# Altium footprint library SAMTEC SMD.PcbLib: 165 footprints (part 8 of 17)
Each footprint in its own frame and in the unit in brackets; x right, y up, seen from the top. Pads: shape width x height; smd on the part's side, far side on the other; paste and mask are expansions set on the pad; w line width, h text height; cw(c..) or ccw(c..) is an arc to the next point about the centre after c.
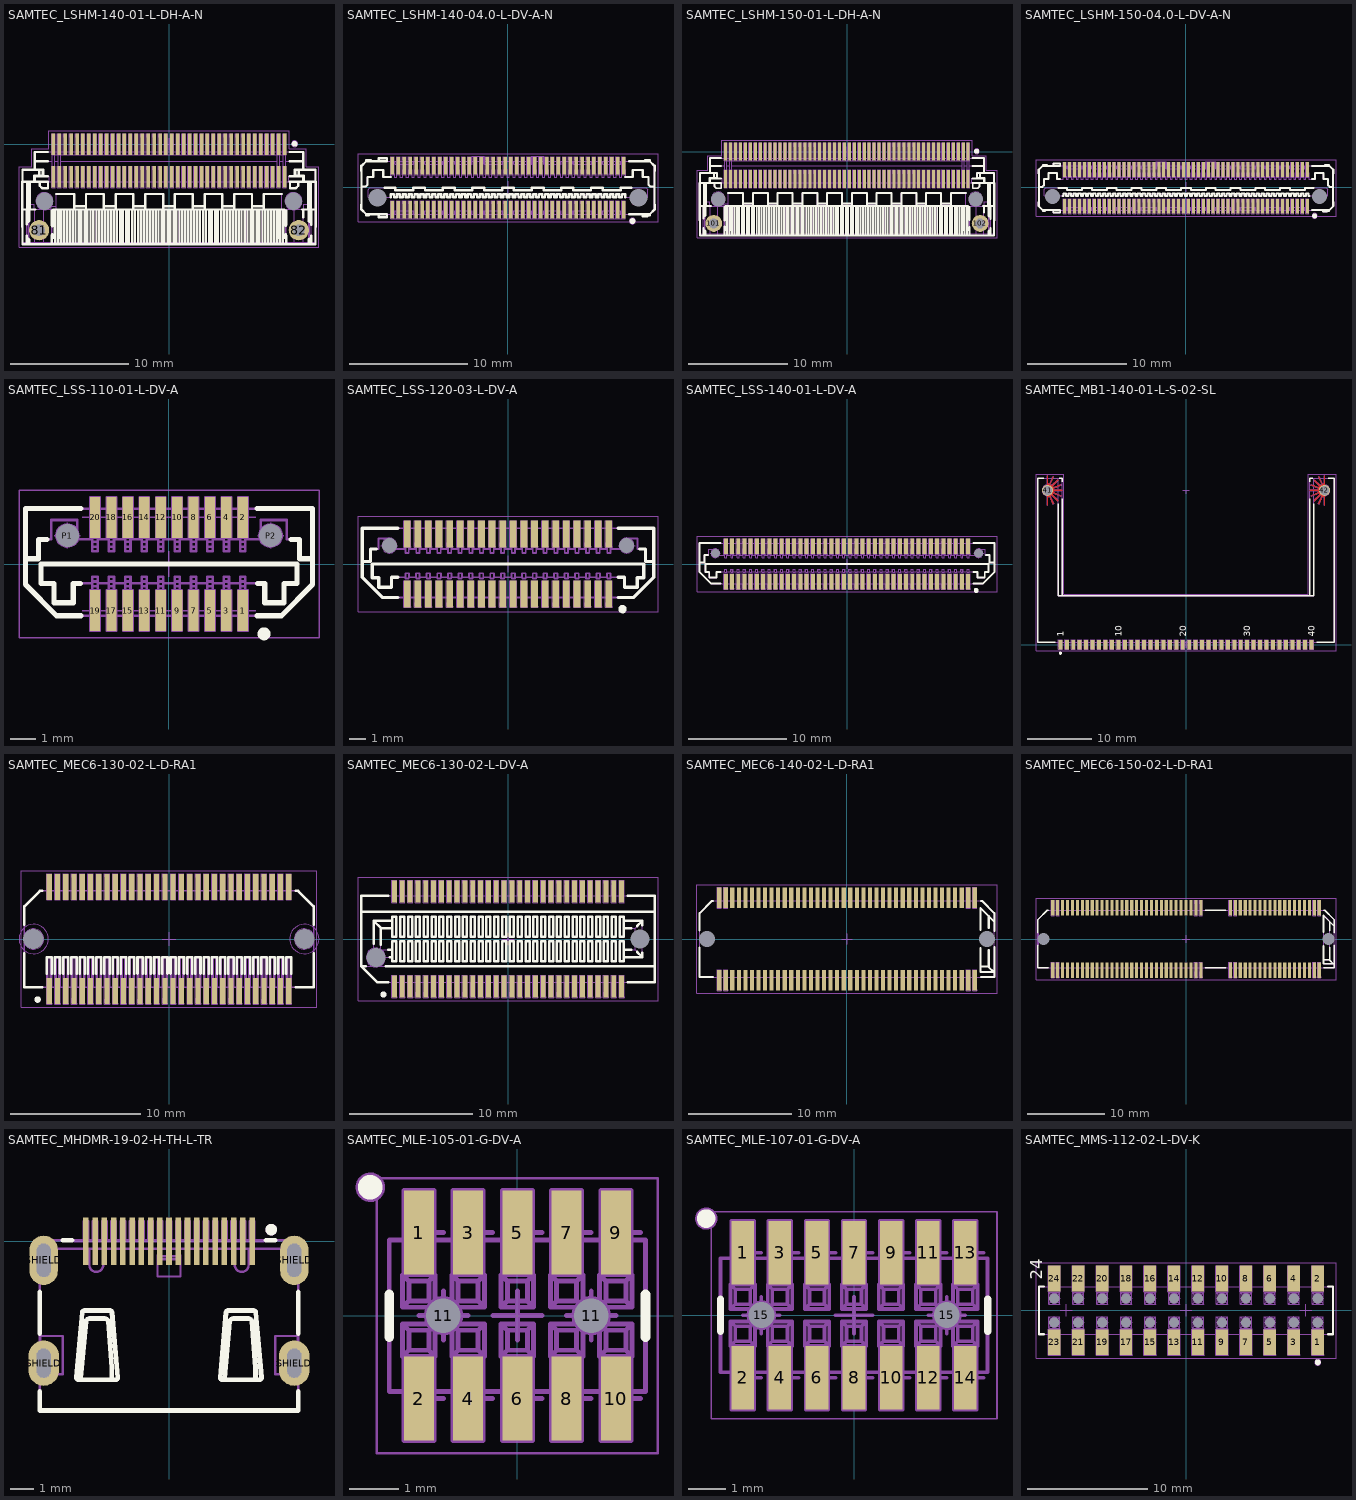
[diagram p7: the footprints below, top view; thin cyan lines are the x and y axes]

## SAMTEC_LSHM-140-01-L-DH-A-N [mm] "80 Contacts, Pitch 0.5mm, Razor Beam™ Right Angled High Speed Hermaphroditic Strip (Witout Shield)"
height 5.13
pads (84):
  rect 0.3x1.8 smd: 1(9.744,-0.003) 2(9.744,-2.753) 3(9.244,-0.003) 4(9.244,-2.753) 5(8.744,-0.003) 6(8.744,-2.753) 7(8.244,-0.003) 8(8.244,-2.753) 9(7.744,-0.003) 10(7.744,-2.753) 11(7.244,-0.003) 12(7.244,-2.753) 13(6.744,-0.003) 14(6.744,-2.753) 15(6.244,-0.003) 16(6.244,-2.753) 17(5.744,-0.003) 18(5.744,-2.753) 19(5.244,-0.003) 20(5.244,-2.753) 21(4.744,-0.003) 22(4.744,-2.753) 23(4.244,-0.003) 24(4.244,-2.753) 25(3.744,-0.003) 26(3.744,-2.753) 27(3.244,-0.003) 28(3.244,-2.753) 29(2.744,-0.003) 30(2.744,-2.753) 31(2.244,-0.003) 32(2.244,-2.753) 33(1.744,-0.003) 34(1.744,-2.753) 35(1.244,-0.003) 36(1.244,-2.753) 37(0.744,-0.003) 38(0.744,-2.753) 39(0.244,-0.003) 40(0.244,-2.753) 41(-0.256,-0.003) 42(-0.256,-2.753) 43(-0.756,-0.003) 44(-0.756,-2.753) 45(-1.256,-0.003) 46(-1.256,-2.753) 47(-1.756,-0.003) 48(-1.756,-2.753) 49(-2.256,-0.003) 50(-2.256,-2.753) 51(-2.756,-0.003) 52(-2.756,-2.753) 53(-3.256,-0.003) 54(-3.256,-2.753) 55(-3.756,-0.003) 56(-3.756,-2.753) 57(-4.256,-0.003) 58(-4.256,-2.753) 59(-4.756,-0.003) 60(-4.756,-2.753) 61(-5.256,-0.003) 62(-5.256,-2.753) 63(-5.756,-0.003) 64(-5.756,-2.753) 65(-6.256,-0.003) 66(-6.256,-2.753) 67(-6.756,-0.003) 68(-6.756,-2.753) 69(-7.256,-0.003) 70(-7.256,-2.753) 71(-7.756,-0.003) 72(-7.756,-2.753) 73(-8.256,-0.003) 74(-8.256,-2.753) 75(-8.756,-0.003) 76(-8.756,-2.753) 77(-9.256,-0.003) 78(-9.256,-2.753) 79(-9.756,-0.003) 80(-9.756,-2.753)
  round 1.7 hole 1: 81(-10.956,-7.253) 82(10.944,-7.253)
  round 0.5 hole 1.45 unplated mask+0.475: 83(-10.506,-4.803) 84(10.494,-4.803)
Top Overlay:
  drawing of 185 lines, arcs and shapes, not listed
Mechanical 8:
  drawing of 507 lines, arcs and shapes, not listed
Mechanical 14:
  drawing of 203 lines, arcs and shapes, not listed
Mechanical 15:
  lines w0.05: -12.65,-8.703 12.65,-8.703 12.65,-1.903 11.565,-1.903 11.565,-0.403 10.144,-0.403 10.144,1.147 -10.156,1.147 -10.156,-0.403 -11.565,-0.403 -11.565,-1.903 -12.65,-1.903 -12.65,-8.703
3D body "SAMTEC_LSHM-140-01-L-DH-A-N.stp": height 5.13, standoff -1.4, extent -12.4,-8.452 12.4,0.55

## SAMTEC_LSHM-140-04.0-L-DV-A-N [mm] "80 Contacts, Pitch 0.5mm, Razor Beam Vertical High Speed Hermaphroditic Strip (Witout Shield)"
height 5.45
pads (82):
  rect 0.3x1.5 smd: 1(9.75,-1.9) 2(9.75,1.8) 3(9.25,-1.9) 4(9.25,1.8) 5(8.75,-1.9) 6(8.75,1.8) 7(8.25,-1.9) 8(8.25,1.8) 9(7.75,-1.9) 10(7.75,1.8) 11(7.25,-1.9) 12(7.25,1.8) 13(6.75,-1.9) 14(6.75,1.8) 15(6.25,-1.9) 16(6.25,1.8) 17(5.75,-1.9) 18(5.75,1.8) 19(5.25,-1.9) 20(5.25,1.8) 21(4.75,-1.9) 22(4.75,1.8) 23(4.25,-1.9) 24(4.25,1.8) 25(3.75,-1.9) 26(3.75,1.8) 27(3.25,-1.9) 28(3.25,1.8) 29(2.75,-1.9) 30(2.75,1.8) 31(2.25,-1.9) 32(2.25,1.8) 33(1.75,-1.9) 34(1.75,1.8) 35(1.25,-1.9) 36(1.25,1.8) 37(0.75,-1.9) 38(0.75,1.8) 39(0.25,-1.9) 40(0.25,1.8) 41(-0.25,-1.9) 42(-0.25,1.8) 43(-0.75,-1.9) 44(-0.75,1.8) 45(-1.25,-1.9) 46(-1.25,1.8) 47(-1.75,-1.9) 48(-1.75,1.8) 49(-2.25,-1.9) 50(-2.25,1.8) 51(-2.75,-1.9) 52(-2.75,1.8) 53(-3.25,-1.9) 54(-3.25,1.8) 55(-3.75,-1.9) 56(-3.75,1.8) 57(-4.25,-1.9) 58(-4.25,1.8) 59(-4.75,-1.9) 60(-4.75,1.8) 61(-5.25,-1.9) 62(-5.25,1.8) 63(-5.75,-1.9) 64(-5.75,1.8) 65(-6.25,-1.9) 66(-6.25,1.8) 67(-6.75,-1.9) 68(-6.75,1.8) 69(-7.25,-1.9) 70(-7.25,1.8) 71(-7.75,-1.9) 72(-7.75,1.8) 73(-8.25,-1.9) 74(-8.25,1.8) 75(-8.75,-1.9) 76(-8.75,1.8) 77(-9.25,-1.9) 78(-9.25,1.8) 79(-9.75,-1.9) 80(-9.75,1.8)
  round 0.5 hole 1.5 unplated mask+0.5: 81(-11,-0.9) 82(11,-0.9)
Top Overlay:
  drawing of 251 lines, arcs and shapes, not listed
Mechanical 8:
  drawing of 493 lines, arcs and shapes, not listed
Mechanical 14:
  drawing of 472 lines, arcs and shapes, not listed
Mechanical 15:
  lines w0.05: -12.65,-2.9 -12.65,2.8 12.65,2.8 12.65,-2.9 -12.65,-2.9
3D body "SAMTEC_LSHM-140-04.0-L-DV-A-N.stp": height 5.45, standoff -0.85, extent -12.4,-2.54 12.4,2.59

## SAMTEC_LSHM-150-01-L-DH-A-N [mm] "100 Contacts, Pitch 0.5mm, Razor Beam™ Right Angled High Speed Hermaphroditic Strip (Witout Shield)"
height 5.13
pads (104):
  rect 0.3x1.8 smd: 1(12.244,-0.003) 2(12.244,-2.753) 3(11.744,-0.003) 4(11.744,-2.753) 5(11.244,-0.003) 6(11.244,-2.753) 7(10.744,-0.003) 8(10.744,-2.753) 9(10.244,-0.003) 10(10.244,-2.753) 11(9.744,-0.003) 12(9.744,-2.753) 13(9.244,-0.003) 14(9.244,-2.753) 15(8.744,-0.003) 16(8.744,-2.753) 17(8.244,-0.003) 18(8.244,-2.753) 19(7.744,-0.003) 20(7.744,-2.753) 21(7.244,-0.003) 22(7.244,-2.753) 23(6.744,-0.003) 24(6.744,-2.753) 25(6.244,-0.003) 26(6.244,-2.753) 27(5.744,-0.003) 28(5.744,-2.753) 29(5.244,-0.003) 30(5.244,-2.753) 31(4.744,-0.003) 32(4.744,-2.753) 33(4.244,-0.003) 34(4.244,-2.753) 35(3.744,-0.003) 36(3.744,-2.753) 37(3.244,-0.003) 38(3.244,-2.753) 39(2.744,-0.003) 40(2.744,-2.753) 41(2.244,-0.003) 42(2.244,-2.753) 43(1.744,-0.003) 44(1.744,-2.753) 45(1.244,-0.003) 46(1.244,-2.753) 47(0.744,-0.003) 48(0.744,-2.753) 49(0.244,-0.003) 50(0.244,-2.753) 51(-0.256,-0.003) 52(-0.256,-2.753) 53(-0.756,-0.003) 54(-0.756,-2.753) 55(-1.256,-0.003) 56(-1.256,-2.753) 57(-1.756,-0.003) 58(-1.756,-2.753) 59(-2.256,-0.003) 60(-2.256,-2.753) 61(-2.756,-0.003) 62(-2.756,-2.753) 63(-3.256,-0.003) 64(-3.256,-2.753) 65(-3.756,-0.003) 66(-3.756,-2.753) 67(-4.256,-0.003) 68(-4.256,-2.753) 69(-4.756,-0.003) 70(-4.756,-2.753) 71(-5.256,-0.003) 72(-5.256,-2.753) 73(-5.756,-0.003) 74(-5.756,-2.753) 75(-6.256,-0.003) 76(-6.256,-2.753) 77(-6.756,-0.003) 78(-6.756,-2.753) 79(-7.256,-0.003) 80(-7.256,-2.753) 81(-7.756,-0.003) 82(-7.756,-2.753) 83(-8.256,-0.003) 84(-8.256,-2.753) 85(-8.756,-0.003) 86(-8.756,-2.753) 87(-9.256,-0.003) 88(-9.256,-2.753) 89(-9.756,-0.003) 90(-9.756,-2.753) 91(-10.256,-0.003) 92(-10.256,-2.753) 93(-10.756,-0.003) 94(-10.756,-2.753) 95(-11.256,-0.003) 96(-11.256,-2.753) 97(-11.756,-0.003) 98(-11.756,-2.753) 99(-12.256,-0.003) 100(-12.256,-2.753)
  round 1.7 hole 1: 101(-13.456,-7.253) 102(13.444,-7.253)
  round 0.5 hole 1.45 unplated mask+0.475: 103(-13.006,-4.803) 104(12.994,-4.803)
Top Overlay:
  drawing of 213 lines, arcs and shapes, not listed
Mechanical 8:
  drawing of 630 lines, arcs and shapes, not listed
Mechanical 14:
  drawing of 231 lines, arcs and shapes, not listed
Mechanical 15:
  lines w0.05: -15.15,-8.703 15.15,-8.703 15.15,-1.903 14.065,-1.903 14.065,-0.403 12.644,-0.403 12.644,1.147 -12.656,1.147 -12.656,-0.403 -14.065,-0.403 -14.065,-1.903 -15.15,-1.903 -15.15,-8.703
3D body "SAMTEC_LSHM-150-01-L-DH-A-N.stp": height 5.13, standoff -1.4, extent -14.9,-8.452 14.9,0.55

## SAMTEC_LSHM-150-04.0-L-DV-A-N [mm] "100 Contacts, Pitch 0.5mm, Razor Beam Vertical High Speed Hermaphroditic Strip (Witout Shield)"
height 5.45
pads (102):
  rect 0.3x1.5 smd: 1(12.25,-1.9) 2(12.25,1.8) 3(11.75,-1.9) 4(11.75,1.8) 5(11.25,-1.9) 6(11.25,1.8) 7(10.75,-1.9) 8(10.75,1.8) 9(10.25,-1.9) 10(10.25,1.8) 11(9.75,-1.9) 12(9.75,1.8) 13(9.25,-1.9) 14(9.25,1.8) 15(8.75,-1.9) 16(8.75,1.8) 17(8.25,-1.9) 18(8.25,1.8) 19(7.75,-1.9) 20(7.75,1.8) 21(7.25,-1.9) 22(7.25,1.8) 23(6.75,-1.9) 24(6.75,1.8) 25(6.25,-1.9) 26(6.25,1.8) 27(5.75,-1.9) 28(5.75,1.8) 29(5.25,-1.9) 30(5.25,1.8) 31(4.75,-1.9) 32(4.75,1.8) 33(4.25,-1.9) 34(4.25,1.8) 35(3.75,-1.9) 36(3.75,1.8) 37(3.25,-1.9) 38(3.25,1.8) 39(2.75,-1.9) 40(2.75,1.8) 41(2.25,-1.9) 42(2.25,1.8) 43(1.75,-1.9) 44(1.75,1.8) 45(1.25,-1.9) 46(1.25,1.8) 47(0.75,-1.9) 48(0.75,1.8) 49(0.25,-1.9) 50(0.25,1.8) 51(-0.25,-1.9) 52(-0.25,1.8) 53(-0.75,-1.9) 54(-0.75,1.8) 55(-1.25,-1.9) 56(-1.25,1.8) 57(-1.75,-1.9) 58(-1.75,1.8) 59(-2.25,-1.9) 60(-2.25,1.8) 61(-2.75,-1.9) 62(-2.75,1.8) 63(-3.25,-1.9) 64(-3.25,1.8) 65(-3.75,-1.9) 66(-3.75,1.8) 67(-4.25,-1.9) 68(-4.25,1.8) 69(-4.75,-1.9) 70(-4.75,1.8) 71(-5.25,-1.9) 72(-5.25,1.8) 73(-5.75,-1.9) 74(-5.75,1.8) 75(-6.25,-1.9) 76(-6.25,1.8) 77(-6.75,-1.9) 78(-6.75,1.8) 79(-7.25,-1.9) 80(-7.25,1.8) 81(-7.75,-1.9) 82(-7.75,1.8) 83(-8.25,-1.9) 84(-8.25,1.8) 85(-8.75,-1.9) 86(-8.75,1.8) 87(-9.25,-1.9) 88(-9.25,1.8) 89(-9.75,-1.9) 90(-9.75,1.8) 91(-10.25,-1.9) 92(-10.25,1.8) 93(-10.75,-1.9) 94(-10.75,1.8) 95(-11.25,-1.9) 96(-11.25,1.8) 97(-11.75,-1.9) 98(-11.75,1.8) 99(-12.25,-1.9) 100(-12.25,1.8)
  round 0.5 hole 1.5 unplated mask+0.5: 101(-13.5,-0.9) 102(13.5,-0.9)
Top Overlay:
  drawing of 301 lines, arcs and shapes, not listed
Mechanical 8:
  drawing of 612 lines, arcs and shapes, not listed
Mechanical 14:
  drawing of 578 lines, arcs and shapes, not listed
Mechanical 15:
  lines w0.05: -15.15,-2.9 -15.15,2.8 15.15,2.8 15.15,-2.9 -15.15,-2.9
3D body "SAMTEC_LSHM-150-04.0-L-DV-A-N.stp": height 5.45, standoff -0.85, extent -14.9,-2.54 14.9,2.59

## SAMTEC_LSS-110-01-L-DV-A [mm] "20 Contacts, Pitch 0.635mm, Razor Beam LSS Vertical High Speed Hermaphroditic Strip (Lead Style 4.5mm)"
height 4.57
pads (22):
  rect 0.4x1.6 smd: 1(2.857,-1.8) 2(2.857,1.8) 3(2.222,-1.8) 4(2.222,1.8) 5(1.587,-1.8) 6(1.587,1.8) 7(0.953,-1.8) 8(0.953,1.8) 9(0.318,-1.8) 10(0.318,1.8) 11(-0.318,-1.8) 12(-0.318,1.8) 13(-0.953,-1.8) 14(-0.953,1.8) 15(-1.587,-1.8) 16(-1.587,1.8) 17(-2.222,-1.8) 18(-2.222,1.8) 19(-2.857,-1.8) 20(-2.857,1.8)
  round 0.5 hole 0.9 unplated mask+0.2: P1(-3.925,1.1) P2(3.93,1.1)
Top Overlay:
  circle w0.25: c3.675,-2.7 r0.125
  lines w0.2: -4.725,0.95 -5.048,0.95 -5.048,0.2 -5.547,0.2 ; -3.429,-0.75 -3.698,-0.75 -3.698,-1.5 -4.447,-1.5 -4.447,-0.75 -4.948,-0.75 -4.948,0 4.952,0 4.952,-0.75 4.453,-0.75 4.453,-1.5 3.702,-1.5 3.702,-0.75 3.434,-0.75 ; -3.407,-2 -4.345,-2 -5.547,-0.798 -5.547,0.2 ; -3.407,2.14 -5.547,2.14 -5.547,0.2 ; 3.413,-2 4.35,-2 5.553,-0.798 5.553,0.2 ; 3.413,2.14 5.553,2.14 5.553,0.2 ; 4.73,0.95 5.052,0.95 5.052,0.2 5.553,0.2
Mechanical 8:
  drawing of 174 lines, arcs and shapes, not listed
Mechanical 14:
  drawing of 383 lines, arcs and shapes, not listed
Mechanical 15:
  lines w0.05: -5.797,-2.85 -5.797,2.85 5.803,2.85 5.803,-2.85 -5.797,-2.85
3D body "SAMTEC_LSS-110-01-L-DV-A.stp": height 4.5, standoff -0.85, extent -5.547,-2.3 5.553,2.3

## SAMTEC_LSS-120-03-L-DV-A [mm] "40 Contacts, Pitch 0.635mm, Razor Beam LSS Vertical High Speed Hermaphroditic Strip (Lead Style 5.49mm)"
height 5.57
pads (42):
  rect 0.4x1.6 smd: 1(6.032,-1.8) 2(6.032,1.8) 3(5.397,-1.8) 4(5.397,1.8) 5(4.763,-1.8) 6(4.763,1.8) 7(4.127,-1.8) 8(4.127,1.8) 9(3.492,-1.8) 10(3.492,1.8) 11(2.857,-1.8) 12(2.857,1.8) 13(2.222,-1.8) 14(2.222,1.8) 15(1.587,-1.8) 16(1.587,1.8) 17(0.953,-1.8) 18(0.953,1.8) 19(0.318,-1.8) 20(0.318,1.8) 21(-0.318,-1.8) 22(-0.318,1.8) 23(-0.953,-1.8) 24(-0.953,1.8) 25(-1.587,-1.8) 26(-1.587,1.8) 27(-2.222,-1.8) 28(-2.222,1.8) 29(-2.857,-1.8) 30(-2.857,1.8) 31(-3.492,-1.8) 32(-3.492,1.8) 33(-4.127,-1.8) 34(-4.127,1.8) 35(-4.763,-1.8) 36(-4.763,1.8) 37(-5.397,-1.8) 38(-5.397,1.8) 39(-6.032,-1.8) 40(-6.032,1.8)
  round 0.5 hole 0.9 unplated mask+0.2: P1(-7.1,1.1) P2(7.1,1.1)
Top Overlay:
  circle w0.25: c6.85,-2.7 r0.125
  lines w0.2: -8.725,0.15 -8.225,0.15 -8.225,0.9 -7.869,0.9 ; -6.582,-2 -7.525,-2 -8.725,-0.8 -8.725,2.14 -6.582,2.14 ; -6.582,-0.8 -6.975,-0.8 -6.975,-1.4 -7.725,-1.4 -7.725,-0.83 -8.125,-0.83 -8.125,0 8.125,0 8.125,-0.83 7.725,-0.83 7.725,-1.4 6.975,-1.4 6.975,-0.8 6.582,-0.8 ; 6.582,-2 7.525,-2 8.725,-0.8 8.725,2.14 6.582,2.14 ; 7.869,0.9 8.225,0.9 8.225,0.15 8.725,0.15
Mechanical 8:
  drawing of 254 lines, arcs and shapes, not listed
Mechanical 14:
  drawing of 451 lines, arcs and shapes, not listed
Mechanical 15:
  lines w0.05: -8.975,-2.85 8.975,-2.85 8.975,2.85 -8.975,2.85 -8.975,-2.85
3D body "SAMTEC_LSS-120-03-L-DV-A.stp": height 5.3, standoff -1, extent -8.725,-2.3 8.725,2.3

## SAMTEC_LSS-140-01-L-DV-A [mm] "80 Contacts, Pitch 0.635mm, Razor Beam LSS Vertical High Speed Hermaphroditic Strip (Lead Style 4.5mm)"
height 4.57
pads (82):
  rect 0.4x1.6 smd: 1(12.383,-1.8) 2(12.383,1.8) 3(11.747,-1.8) 4(11.747,1.8) 5(11.112,-1.8) 6(11.112,1.8) 7(10.477,-1.8) 8(10.477,1.8) 9(9.842,-1.8) 10(9.842,1.8) 11(9.207,-1.8) 12(9.207,1.8) 13(8.572,-1.8) 14(8.572,1.8) 15(7.938,-1.8) 16(7.938,1.8) 17(7.302,-1.8) 18(7.302,1.8) 19(6.667,-1.8) 20(6.667,1.8) 21(6.032,-1.8) 22(6.032,1.8) 23(5.397,-1.8) 24(5.397,1.8) 25(4.763,-1.8) 26(4.763,1.8) 27(4.127,-1.8) 28(4.127,1.8) 29(3.492,-1.8) 30(3.492,1.8) 31(2.857,-1.8) 32(2.857,1.8) 33(2.222,-1.8) 34(2.222,1.8) 35(1.587,-1.8) 36(1.587,1.8) 37(0.953,-1.8) 38(0.953,1.8) 39(0.318,-1.8) 40(0.318,1.8) 41(-0.318,-1.8) 42(-0.318,1.8) 43(-0.953,-1.8) 44(-0.953,1.8) 45(-1.587,-1.8) 46(-1.587,1.8) 47(-2.222,-1.8) 48(-2.222,1.8) 49(-2.857,-1.8) 50(-2.857,1.8) 51(-3.492,-1.8) 52(-3.492,1.8) 53(-4.127,-1.8) 54(-4.127,1.8) 55(-4.763,-1.8) 56(-4.763,1.8) 57(-5.397,-1.8) 58(-5.397,1.8) 59(-6.032,-1.8) 60(-6.032,1.8) 61(-6.667,-1.8) 62(-6.667,1.8) 63(-7.302,-1.8) 64(-7.302,1.8) 65(-7.938,-1.8) 66(-7.938,1.8) 67(-8.572,-1.8) 68(-8.572,1.8) 69(-9.207,-1.8) 70(-9.207,1.8) 71(-9.842,-1.8) 72(-9.842,1.8) 73(-10.477,-1.8) 74(-10.477,1.8) 75(-11.112,-1.8) 76(-11.112,1.8) 77(-11.747,-1.8) 78(-11.747,1.8) 79(-12.383,-1.8) 80(-12.383,1.8)
  round 0.5 hole 0.9 unplated mask+0.2: P1(-13.45,1.1) P2(13.45,1.1)
Top Overlay:
  circle w0.25: c13.2,-2.7 r0.125
  lines w0.2: -15.075,0.15 -14.575,0.15 -14.575,0.9 -14.219,0.9 ; -12.932,-2 -13.875,-2 -15.075,-0.8 -15.075,2.14 -12.932,2.14 ; -12.932,-0.8 -13.325,-0.8 -13.325,-1.4 -14.075,-1.4 -14.075,-0.83 -14.475,-0.83 -14.475,0 14.475,0 14.475,-0.83 14.075,-0.83 14.075,-1.4 13.325,-1.4 13.325,-0.8 12.932,-0.8 ; 12.932,-2 13.875,-2 15.075,-0.8 15.075,2.14 12.932,2.14 ; 14.219,0.9 14.575,0.9 14.575,0.15 15.075,0.15
Mechanical 8:
  drawing of 494 lines, arcs and shapes, not listed
Mechanical 14:
  drawing of 871 lines, arcs and shapes, not listed
Mechanical 15:
  lines w0.05: -15.325,-2.85 15.325,-2.85 15.325,2.85 -15.325,2.85 -15.325,-2.85
3D body "SAMTEC_LSS-140-01-L-DV-A.stp": height 4.5, standoff -0.8, extent -15.075,-2.3 15.075,2.3

## SAMTEC_MB1-140-01-L-S-02-SL [mm] "40 Contacts, Pitch 1mm, Mini Edge Card Socket With Guides, MB1 Series"
height 5.44
pads (42):
  rect 0.61x1.45 smd: 1(-19.5,0) 2(-18.5,0) 3(-17.5,0) 4(-16.5,0) 5(-15.5,0) 6(-14.5,0) 7(-13.5,0) 8(-12.5,0) 9(-11.5,0) 10(-10.5,0) 11(-9.5,0) 12(-8.5,0) 13(-7.5,0) 14(-6.5,0) 15(-5.5,0) 16(-4.5,0) 17(-3.5,0) 18(-2.5,0) 19(-1.5,0) 20(-0.5,0) 21(0.5,0) 22(1.5,0) 23(2.5,0) 24(3.5,0) 25(4.5,0) 26(5.5,0) 27(6.5,0) 28(7.5,0) 29(8.5,0) 30(9.5,0) 31(10.5,0) 32(11.5,0) 33(12.5,0) 34(13.5,0) 35(14.5,0) 36(15.5,0) 37(16.5,0) 38(17.5,0) 39(18.5,0) 40(19.5,0)
  round 1.7 / inner round 2.1 / far side round 2.1 hole 1.4: 41(-21.49,23.952) 42(21.49,23.952)
Top Layer:
  region: -21.554,21.666 -21.427,21.666 -21.427,22.938 -21.393,22.94 -21.325,22.949 -21.258,22.962 -21.193,22.98 -21.161,22.991 -20.674,21.816 -20.557,21.864 -21.043,23.039 -21.013,23.054 -20.954,23.088 -20.897,23.126 -20.843,23.168 -20.818,23.19 -19.918,22.291 -19.829,22.38 -20.728,23.28 -20.706,23.305 -20.664,23.359 -20.626,23.416 -20.592,23.475 -20.577,23.505 -19.402,23.019 -19.354,23.136 -20.529,23.623 -20.518,23.655 -20.5,23.72 -20.487,23.787 -20.478,23.855 -20.476,23.888 -19.204,23.888 -19.204,24.015 -20.476,24.015 -20.478,24.049 -20.487,24.117 -20.5,24.184 -20.518,24.249 -20.529,24.281 -19.354,24.768 -19.402,24.885 -20.577,24.399 -20.592,24.429 -20.626,24.488 -20.664,24.545 -20.706,24.599 -20.728,24.624 -19.829,25.524 -19.918,25.613 -20.818,24.714 -20.843,24.736 -20.897,24.778 -20.954,24.816 -21.013,24.85 -21.043,24.865 -20.557,26.04 -20.674,26.088 -21.161,24.913 -21.193,24.924 -21.258,24.942 -21.325,24.955 -21.393,24.964 -21.427,24.966 -21.427,26.238 -21.554,26.238 -21.553,24.66 -21.455,24.662 -21.263,24.626 -21.087,24.538 -20.942,24.406 -20.839,24.239 -20.786,24.05 -20.786,23.854 -20.839,23.665 -20.942,23.498 -21.087,23.366 -21.263,23.278 -21.455,23.242 -21.553,23.244 -21.554,23.244
  region: 19.402,23.019 19.354,23.136 20.529,23.623 20.518,23.655 20.5,23.72 20.487,23.787 20.478,23.855 20.476,23.888 19.204,23.888 19.204,24.015 20.476,24.015 20.478,24.049 20.487,24.117 20.5,24.184 20.518,24.249 20.529,24.281 19.354,24.768 19.402,24.885 20.577,24.399 20.592,24.429 20.626,24.488 20.664,24.545 20.706,24.599 20.728,24.624 19.829,25.524 19.918,25.613 20.818,24.714 20.843,24.736 20.897,24.778 20.954,24.816 21.013,24.85 21.043,24.865 20.557,26.04 20.674,26.088 21.161,24.913 21.193,24.924 21.258,24.942 21.325,24.955 21.393,24.964 21.427,24.966 21.427,26.238 21.554,26.238 21.554,24.66 21.455,24.662 21.263,24.626 21.087,24.538 20.942,24.406 20.839,24.239 20.786,24.05 20.786,23.854 20.839,23.665 20.942,23.498 21.087,23.366 21.263,23.278 21.455,23.242 21.554,23.244 21.554,21.666 21.427,21.666 21.427,22.938 21.393,22.94 21.325,22.949 21.258,22.962 21.193,22.98 21.161,22.991 20.674,21.816 20.557,21.864 21.043,23.039 21.013,23.054 20.954,23.088 20.897,23.126 20.843,23.168 20.818,23.19 19.918,22.291 19.829,22.38 20.728,23.28 20.706,23.305 20.664,23.359 20.626,23.416 20.592,23.475 20.577,23.505
Top Overlay:
  circle w0.25: c-19.5,-1.325 r0.125
  lines w0.2: -22.053,25.862 -23.032,25.862 -23.032,0.36 -20.305,0.36 ; -19.857,21.883 -19.857,7.6 19.857,7.6 19.857,21.883 ; -19.673,25.862 -19.222,25.862 -19.222,25.295 ; -19.222,7.6 -19.222,22.609 ; 19.222,7.6 19.222,22.609 ; 19.222,25.295 19.222,25.862 19.673,25.862 ; 20.305,0.36 23.032,0.36 23.032,25.862 22.053,25.862
  text "40" at 20,1.25 h1
  text "30" at 10,1.25 h1
  text "20" at 0,1.25 h1
  text "10" at -10,1.25 h1
  text "1" at -19,1.25 h1
Mechanical 8:
  drawing of 333 lines, arcs and shapes, not listed
Mechanical 14:
  lines w0.1: -19.857,25.862 -19.857,7.6 19.857,7.6 19.857,25.862 ; -19.678,0.36 -19.678,-0.33 -19.322,-0.33 -19.322,0.36 ; -19.222,7.6 -19.222,25.862 -23.032,25.862 -23.032,0.36 23.032,0.36 23.032,25.862 19.222,25.862 19.222,7.6 ; -18.678,0.36 -18.678,-0.33 -18.322,-0.33 -18.322,0.36 ; 18.322,0.36 18.322,-0.33 18.678,-0.33 18.678,0.36 ; 19.322,0.36 19.322,-0.33 19.678,-0.33 19.678,0.36
  text "1" at -19,1.25 h1
  text "40" at 20,1.25 h1
Mechanical 15:
  lines w0.05: -23.282,-0.975 -23.282,26.488 -18.972,26.488 -18.972,7.85 18.972,7.85 18.972,26.488 23.282,26.488 23.282,-0.975 -23.282,-0.975
3D body "SAMTEC_MB1-140-01-L-S-02-SL.stp": height 5.44, standoff -1.28, extent -23.032,-0.33 23.032,25.862
